# Altium integrated library Resistors.IntLib: 54 symbols
Pins are listed as number, name and electrical type; pins without a type are passive.

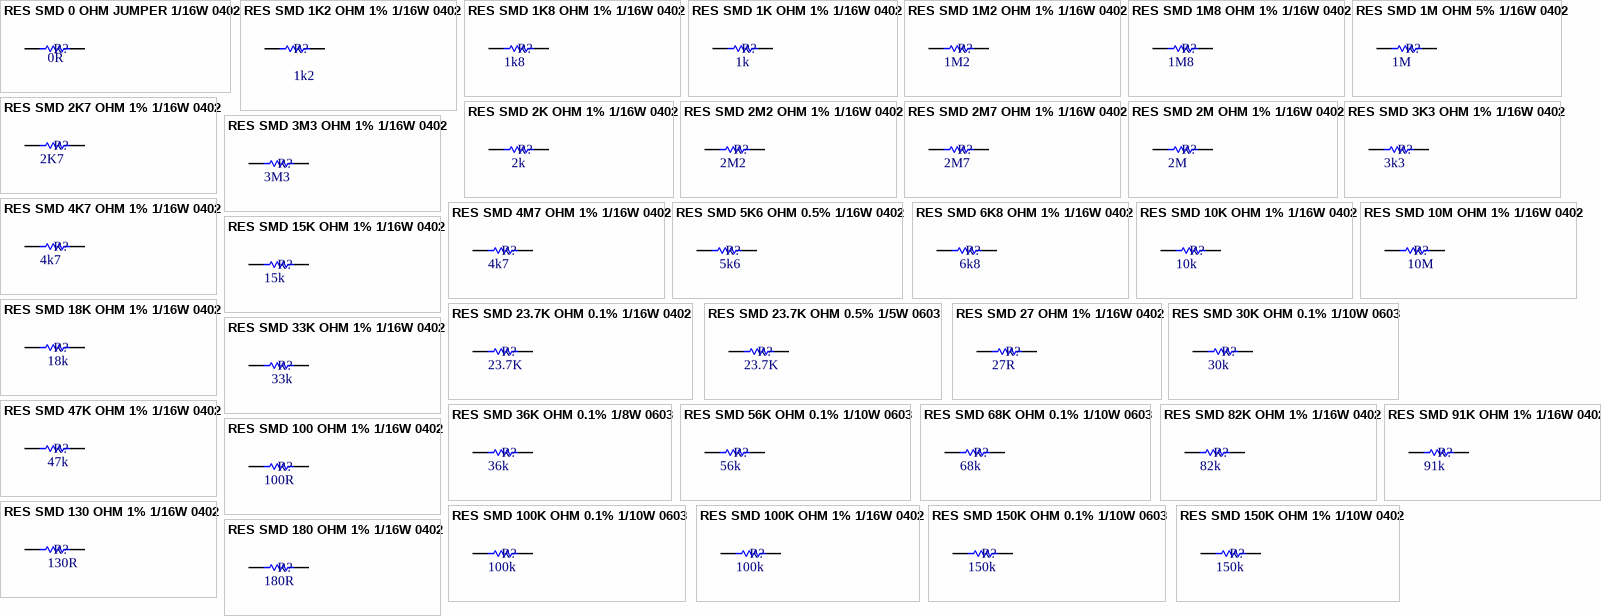
[diagram p0: symbols RES SMD 0 OHM JUMPER 1/16W 0402 to RES SMD 180 OHM 1% 1/16W 0402]

## RES SMD 0 OHM JUMPER 1/16W 0402
designator R?  value 0R
PartNumber1: RC0402JR-070RL
footprint SMD_0402
pins: 1, 2

## RES SMD 1K2 OHM 1% 1/16W 0402
designator R?, comment 1k2
PartNumber1: RC0402FR-071K2L; Value: 1k2
footprint SMD_0402
pins: 1, 2

## RES SMD 1K8 OHM 1% 1/16W 0402
designator R?, comment 1k8
PartNumber1: RC0402FR-0782KL; Value: 1k8
footprint SMD_0402
pins: 1, 2

## RES SMD 1K OHM 1% 1/16W 0402
designator R?, comment 1k
PartNumber1: RC0402FR-071KL; Value: 1k
footprint SMD_0402
pins: 1, 2

## RES SMD 1M2 OHM 1% 1/16W 0402
designator R?, comment 1M2
PartNumber1: RMCF0402FT1M20; Value: 1M2
footprint SMD_0402
pins: 1, 2

## RES SMD 1M8 OHM 1% 1/16W 0402
designator R?, comment 1M8
PartNumber1: RMCF0402FT1M80; Value: 1M8
footprint SMD_0402
pins: 1, 2

## RES SMD 1M OHM 5% 1/16W 0402
designator R?  value 1M
PartNumber1: RC0402JR-071ML
footprint SMD_0402
pins: 1, 2

## RES SMD 2K7 OHM 1% 1/16W 0402
designator R?, comment 2K7
PartNumber1: RC0402FR-072K7L; Value: 2K7
footprint SMD_0402
pins: 1, 2

## RES SMD 2K OHM 1% 1/16W 0402
designator R?, comment 2k
2 kOhms ±1% 0.063W, 1/16W Chip Resistor 0402 (1005 Metric) Moisture Resistant Thick Film; PartNumber1: RC1005F202CS; Value: 2k
footprint SMD_0402
pins: 1, 2

## RES SMD 2M2 OHM 1% 1/16W 0402
designator R?, comment 2M2
PartNumber1: RC1005F225CS; Value: 2M2
footprint SMD_0402
pins: 1, 2

## RES SMD 2M7 OHM 1% 1/16W 0402
designator R?, comment 2M7
PartNumber1: RMCF0402FT2M70; Value: 2M7
footprint SMD_0402
pins: 1, 2

## RES SMD 2M OHM 1% 1/16W 0402
designator R?, comment 2M
PartNumber1: CRCW04022M00FKEDC; Value: 2M
footprint SMD_0402
pins: 1, 2

## RES SMD 3K3 OHM 1% 1/16W 0402
designator R?, comment value 3k3  (hidden comment: 3k3R)
PartNumber1: RC0402FR-073K3L
footprint SMD_0402
pins: 1, 2

## RES SMD 3M3 OHM 1% 1/16W 0402
designator R?  value 3M3
PartNumber1: RC0402FR-073M3L
footprint SMD_0402
pins: 1, 2

## RES SMD 4K7 OHM 1% 1/16W 0402
designator R?, comment 4k7
PartNumber1: RC1005F472CS; Value: 4k7
footprint SMD_0402
pins: 1, 2

## RES SMD 4M7 OHM 1% 1/16W 0402
designator R?, comment 4k7
PartNumber1: RMCF0402FT4M70; Value: 4k7
footprint SMD_0402
pins: 1, 2

## RES SMD 5K6 OHM 0.5% 1/16W 0402
designator R?, comment 5k6
PartNumber1: ERA-2AED562X; Value: 5k6
footprint SMD_0402
pins: 1, 2

## RES SMD 6K8 OHM 1% 1/16W 0402
designator R?, comment 6k8
PartNumber1: RC0402FR-076K8L; Value: 6k8
footprint SMD_0402
pins: 1, 2

## RES SMD 10K OHM 1% 1/16W 0402
designator R?, comment 10k
PartNumber1: RMCF0402FT10K0; Value: 10k
footprint SMD_0402
pins: 1, 2

## RES SMD 10M OHM 1% 1/16W 0402
designator R?, comment 10M
PartNumber1: RC0402FR-0710ML; Value: 10M
footprint SMD_0402
pins: 1, 2

## RES SMD 15K OHM 1% 1/16W 0402
designator R?, comment value 15k  (hidden comment: 15kR)
PartNumber1: RC0402FR-0715KL
footprint SMD_0402
pins: 1, 2

## RES SMD 18K OHM 1% 1/16W 0402
designator R?, comment 18k
PartNumber1: RC0402FR-0718KL; Value: 18k
footprint SMD_0402
pins: 1, 2

## RES SMD 23.7K OHM 0.1% 1/16W 0402
designator R?, comment 23.7K
23.7 kOhms ±0.1% 0.063W, 1/16W Chip Resistor 0402 (1005 Metric)  Thin Film; PartNumber1: RN73C1E23K7BTD; Value: 23.7K
footprint SMD_0402
pins: 1, 2

## RES SMD 23.7K OHM 0.5% 1/5W 0603
designator R?, comment 23.7K
23.7 kOhms ±0.5% 0.2W, 1/5W Chip Resistor 0603 (1608 Metric) Automotive AEC-Q200, Pulse Withstanding Thick Film; PartNumber1: ERJ-PB3D2372V; Value: 23.7K
footprint smd_0603 (General SMD 0603 footprint)
pins: 1, 2

## RES SMD 27 OHM 1% 1/16W 0402
designator R?  value 27R
PartNumber1: RC0402FR-0727RL
footprint SMD_0402
pins: 1, 2

## RES SMD 30K OHM 0.1% 1/10W 0603
designator R?, comment value 30k  (hidden comment: 30kR)
PartNumber1: ERA-3AEB303V
footprint smd_0603 (General SMD 0603 footprint)
pins: 1, 2

## RES SMD 33K OHM 1% 1/16W 0402
designator R?, comment 33k
PartNumber1: RC0402FR-0733KL; Value: 33k
footprint SMD_0402
pins: 1, 2

## RES SMD 36K OHM 0.1% 1/8W 0603
designator R?, comment value 36k  (hidden comment: 36kR)
PartNumber1: TNPW060336K0BEEA
footprint SMD_0603 (General SMD 0603 footprint)
pins: 1, 2

## RES SMD 47K OHM 1% 1/16W 0402
designator R?, comment 47k
PartNumber1: RC0402FR-0747KL; Value: 47k
footprint SMD_0402
pins: 1, 2

## RES SMD 56K OHM 0.1% 1/10W 0603
designator R?, comment value 56k  (hidden comment: 56kR)
PartNumber1: ERA-3AEB563V
footprint SMD_0603 (General SMD 0603 footprint)
pins: 1, 2

## RES SMD 68K OHM 0.1% 1/10W 0603
designator R?, comment value 68k  (hidden comment: 68kR)
PartNumber1: ERA-3AEB683V
footprint SMD_0603 (General SMD 0603 footprint)
pins: 1, 2

## RES SMD 82K OHM 1% 1/16W 0402
designator R?, comment 82k
PartNumber1: RC0402FR-0782KL; Value: 82k
footprint SMD_0402
pins: 1, 2

## RES SMD 91K OHM 1% 1/16W 0402
designator R?, comment 91k
PartNumber1: RC0402FR-0791KL; Value: 91k
footprint SMD_0402
pins: 1, 2

## RES SMD 100 OHM 1% 1/16W 0402
designator R?, comment 100R
PartNumber1: RC0402FR-07100RL; Value: 100R
footprint SMD_0402
pins: 1, 2

## RES SMD 100K OHM 0.1% 1/10W 0603
designator R?, comment value 100k  (hidden comment: 100kR)
PartNumber1: RT0603BRD07390KL
footprint smd_0603 (General SMD 0603 footprint)
pins: 1, 2

## RES SMD 100K OHM 1% 1/16W 0402
designator R?  value 100k
PartNumber1: RMCF0402FT100K
footprint SMD_0402
pins: 1, 2

## RES SMD 130 OHM 1% 1/16W 0402
designator R?, comment 130R
PartNumber1: RMCF0402FT130R; Value: 130R
footprint SMD_0402
pins: 1, 2

## RES SMD 150K OHM 0.1% 1/10W 0603
designator R?, comment value 150k  (hidden comment: 150kR)
PartNumber1: ERA-3AEB154V
footprint SMD_0603 (General SMD 0603 footprint)
pins: 1, 2

## RES SMD 150K OHM 1% 1/10W 0402
designator R?, comment 150k
PartNumber1: MCS04020C1503FE000; Value: 150k
footprint SMD_0402
pins: 1, 2

## RES SMD 180 OHM 1% 1/16W 0402
designator R?, comment 180R
PartNumber1: RMCF0402FT1M80; Value: 180R
footprint SMD_0402
pins: 1, 2

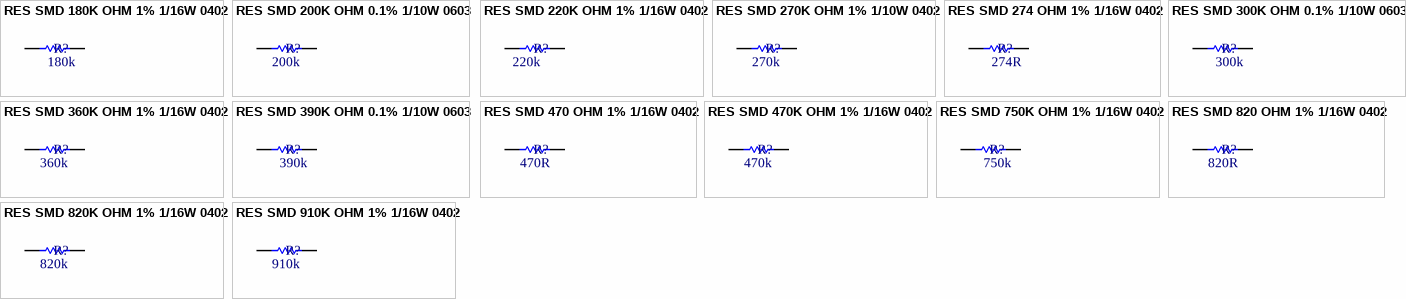
[diagram p1: symbols RES SMD 180K OHM 1% 1/16W 0402 to RES SMD 910K OHM 1% 1/16W 0402]

## RES SMD 180K OHM 1% 1/16W 0402
designator R?, comment 180k
PartNumber1: RC0402FR-07360KL; Value: 180k
footprint SMD_0402
pins: 1, 2

## RES SMD 200K OHM 0.1% 1/10W 0603
designator R?, comment value 200k  (hidden comment: 200kR)
PartNumber1: ERA-3AEB204V
footprint SMD_0603 (General SMD 0603 footprint)
pins: 1, 2

## RES SMD 220K OHM 1% 1/16W 0402
designator R?, comment 220k
PartNumber1: RC0402FR-07220KL; Value: 220k
footprint SMD_0402
pins: 1, 2

## RES SMD 270K OHM 1% 1/10W 0402
designator R?, comment 270k
PartNumber1: ERJ-2RKF2703X; Value: 270k
footprint SMD_0402
pins: 1, 2

## RES SMD 274 OHM 1% 1/16W 0402
designator R?, comment 274R
274 Ohms ±1% 0.063W, 1/16W Chip Resistor 0402 (1005 Metric) Moisture Resistant Thick Film; PartNumber1: RC0402FR-07274RL; Value: 274R
footprint SMD_0402
pins: 1, 2

## RES SMD 300K OHM 0.1% 1/10W 0603
designator R?, comment value 300k  (hidden comment: 300kR)
PartNumber1: ERA-3AEB304V
footprint smd_0603 (General SMD 0603 footprint)
pins: 1, 2

## RES SMD 360K OHM 1% 1/16W 0402
designator R?, comment 360k
PartNumber1: RC0402FR-07360KL; Value: 360k
footprint SMD_0402
pins: 1, 2

## RES SMD 390K OHM 0.1% 1/10W 0603
designator R?, comment value 390k  (hidden comment: 390kR)
PartNumber1: RT0603BRD07390KL
footprint SMD_0603 (General SMD 0603 footprint)
pins: 1, 2

## RES SMD 470 OHM 1% 1/16W 0402
designator R?, comment 470R
PartNumber1: RC0402FR-07470RL; Value: 470R
footprint SMD_0402
pins: 1, 2

## RES SMD 470K OHM 1% 1/16W 0402
designator R?, comment 470k
PartNumber1: RC0402FR-07470KL; Value: 470k
footprint SMD_0402
pins: 1, 2

## RES SMD 750K OHM 1% 1/16W 0402
designator R?  value 750k
PartNumber1: RC0402FR-07750KL
footprint SMD_0402
pins: 1, 2

## RES SMD 820 OHM 1% 1/16W 0402
designator R?, comment 820R
PartNumber1: RC0402FR-07820RL; Value: 820R
footprint SMD_0402
pins: 1, 2

## RES SMD 820K OHM 1% 1/16W 0402
designator R?, comment 820k
PartNumber1: RC0402FR-07820KL; Value: 820k
footprint SMD_0402
pins: 1, 2

## RES SMD 910K OHM 1% 1/16W 0402
designator R?, comment 910k
PartNumber1: RC0402FR-07910KL; Value: 910k
footprint SMD_0402
pins: 1, 2